# Altium footprint library 20210518.PcbLib: 414 footprints (part 8 of 26)
Each footprint in its own frame and in the unit in brackets; x right, y up, seen from the top. Pads: shape width x height; smd on the part's side, far side on the other; paste and mask are expansions set on the pad; w line width, h text height; cw(c..) or ccw(c..) is an arc to the next point about the centre after c.
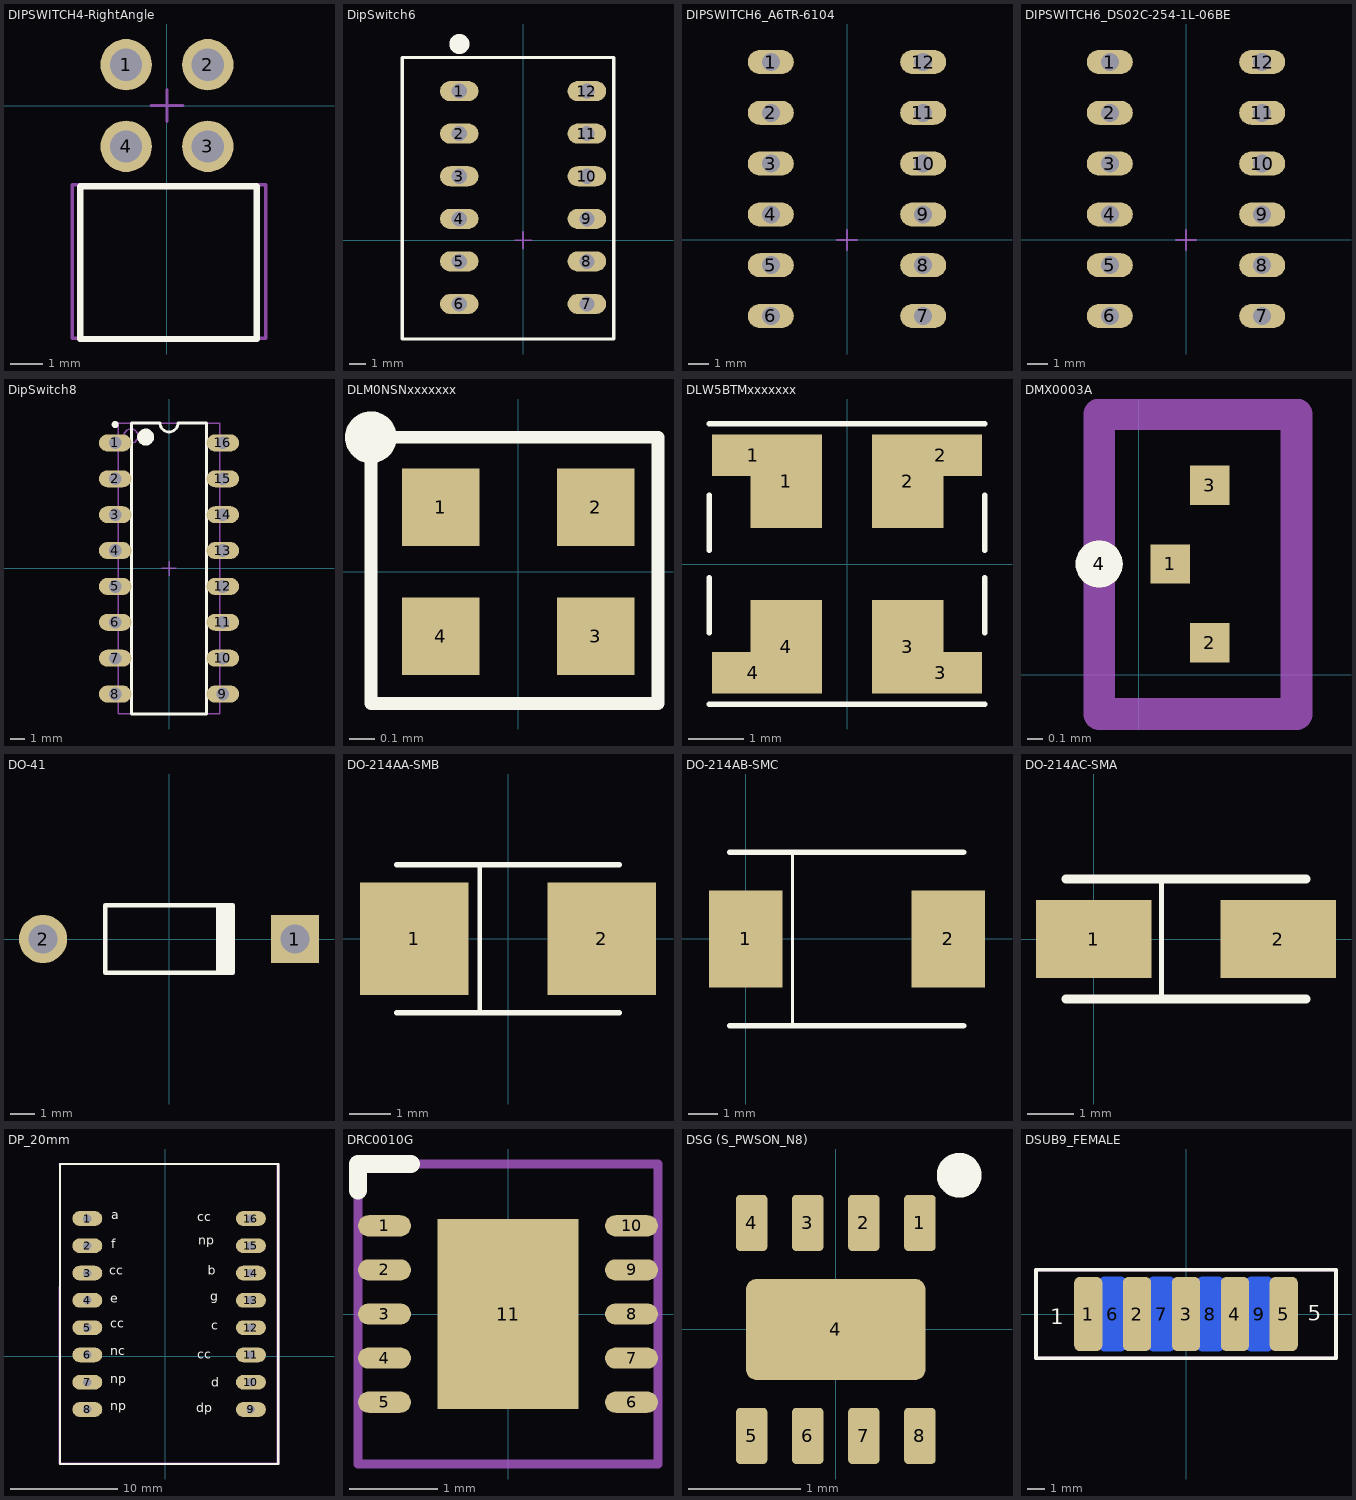
[diagram p7: the footprints below, top view; thin cyan lines are the x and y axes]

## DIPSWITCH4-RightAngle [mm]
pads (4):
  round 1.6 hole 1: 1(-1.27,1.27) 2(1.27,1.27) 3(1.27,-1.27) 4(-1.27,-1.27)
Top Overlay:
  lines w0.2: 2.769,-2.515 -2.701,-2.515 -2.701,-7.264 2.794,-7.264 2.794,-2.514
Mechanical 13:
  lines w0.1: -2.946,-7.239 -2.946,-2.464 3.073,-2.464 3.073,-7.239 -2.946,-7.239
Mechanical 15:
  lines w0.1: -0.5,0 0.5,0 ; 0,-0.5 0,0.5
3D body: height 9.79, standoff -3.04, extent -2.972,-8.356 3.124,1.664

## DipSwitch6 [mm]
pads (12):
  oval 2.3x1.2 hole 0.9: 1(-3.81,8.89) 2(-3.81,6.35) 3(-3.81,3.81) 4(-3.81,1.27) 5(-3.81,-1.27) 6(-3.81,-3.81) 7(3.81,-3.81) 8(3.81,-1.27) 9(3.81,1.27) 10(3.81,3.81) 11(3.81,6.35) 12(3.81,8.89)
Top Overlay:
  circle w0.6: c-3.8,11.7 r0.3
  lines w0.2: -7.2,-5.9 -7.2,10.9 5.4,10.9 5.4,-5.9 -7.2,-5.9
Mechanical 13:
  lines w0.1: -7.2,-5.9 -7.2,10.9 5.4,10.9 5.4,-5.9 -7.2,-5.9
Mechanical 15:
  lines w0.1: -0.5,0 0.5,0 ; 0,-0.5 0,0.5
3D body: height 10.4, standoff -3, extent -7.2,-5.9 5.4,10.9

## DIPSWITCH6_A6TR-6104 [mm] "Dip Switch SPST 6 Position Through Hole, Right Angle Piano Actuator 25mA 24VDC"
pads (12):
  oval 2.3x1.2 hole 0.9: 1(-3.81,8.89) 2(-3.81,6.35) 3(-3.81,3.81) 4(-3.81,1.27) 5(-3.81,-1.27) 6(-3.81,-3.81) 7(3.81,-3.81) 8(3.81,-1.27) 9(3.81,1.27) 10(3.81,3.81) 11(3.81,6.35) 12(3.81,8.89)
Mechanical 15:
  lines w0.1: -0.5,0 0.5,0 ; 0,-0.5 0,0.5
3D body: height 5, standoff -3.5, extent -4.02,-4.99 3.85,10.15

## DIPSWITCH6_DS02C-254-1L-06BE [mm] "Dip Switch SPST 6 Position Through Hole, Right Angle Piano Actuator 25mA 24VDC"
pads (12):
  oval 2.3x1.2 hole 0.9: 1(-3.81,8.89) 2(-3.81,6.35) 3(-3.81,3.81) 4(-3.81,1.27) 5(-3.81,-1.27) 6(-3.81,-3.81) 7(3.81,-3.81) 8(3.81,-1.27) 9(3.81,1.27) 10(3.81,3.81) 11(3.81,6.35) 12(3.81,8.89)
Mechanical 15:
  lines w0.1: -0.5,0 0.5,0 ; 0,-0.5 0,0.5
3D body: height 9.46, standoff -3.8, extent -5.11,-5.795 7.77,11.015

## DipSwitch8 [mm]
pads (16):
  oval 2.3x1.2 hole 0.9: 1(-3.81,8.89) 2(-3.81,6.35) 3(-3.81,3.81) 4(-3.81,1.27) 5(-3.81,-1.27) 6(-3.81,-3.81) 7(-3.81,-6.35) 8(-3.81,-8.89) 9(3.81,-8.89) 10(3.81,-6.35) 11(3.81,-3.81) 12(3.81,-1.27) 13(3.81,1.27) 14(3.81,3.81) 15(3.81,6.35) 16(3.81,8.89)
Top Overlay:
  circle w0.6: c-1.65,9.3 r0.3
  circle w0.25: c-3.81,10.19 r0.125
  lines w0.2: -2.65,-10.3 2.65,-10.3 2.65,10.3 0.635,10.3 cw(c0,10.3) -0.635,10.3 -2.65,10.3 -2.65,-10.3
Mechanical 13:
  circle w0.1: c-2.7,9.375 r0.5
  lines w0.1: -3.6,-10.275 3.6,-10.275 3.6,10.275 -3.6,10.275 -3.6,-10.275
Mechanical 15:
  lines w0.1: -0.5,0 0.5,0 ; 0,-0.5 0,0.5
3D body: height 8.25, standoff -3.5, extent -4.89,-11.25 4.89,11.25

## DLM0NSNxxxxxxx [mm]
pads (4):
  rect 0.3x0.3 smd mask+0: 1(-0.3,0.25) 2(0.3,0.25) 3(0.3,-0.25) 4(-0.3,-0.25)
Top Overlay:
  circle w0.1: c-0.57,0.52 r0.05
  lines w0.05: -0.57,-0.51 0.54,-0.51 0.54,0.52 -0.57,0.52 -0.57,-0.51
Top Solder:
  region: -0.15,0.1 -0.45,0.1 -0.45,0.4 -0.15,0.4
  region: 0.45,0.1 0.15,0.1 0.15,0.4 0.45,0.4
  region: -0.15,-0.4 -0.45,-0.4 -0.45,-0.1 -0.15,-0.1
  region: 0.45,-0.4 0.15,-0.4 0.15,-0.1 0.45,-0.1
3D body: height 0.5, standoff 0, extent -0.325,-0.425 0.325,0.425

## DLW5BTMxxxxxxx [mm] "5*5*3mm"
height 3
pads (8):
  rect 1.5x0.75 smd: 1(-1.7,1.975) 2(1.7,1.975) 3(1.7,-1.975) 4(-1.7,-1.975)
  rect 1.3x1.7 smd: 1(-1.1,1.5) 2(1.1,1.5) 3(1.1,-1.5) 4(-1.1,-1.5)
Top Overlay:
  lines w0.1: -2.5,-2.55 2.5,-2.55 ; -2.5,-1.25 -2.5,-0.25 ; -2.5,0.25 -2.5,1.25 ; -2.5,2.55 2.5,2.55 ; 2.5,-1.25 2.5,-0.25 ; 2.5,0.25 2.5,1.25
3D body: height 2.5, standoff 0, extent -2.5,-2.51 2.5,2.49

## DMX0003A [mm] "X2SON - 0.4 mm max height"
height 0.4
pads (4):
  rect 0.25x0.25 smd: 1(0.2,0.7) 2(0.45,0.2) 3(0.45,1.2)
  round 0.3 on Top Overlay: 4(-0.25,0.7)
3D Body:
  lines w0.2: -0.25,-0.25 -0.25,-0.2 -0.25,1.65 1,1.65 1,-0.25 -0.25,-0.25
3D body: height 0.4, standoff 0.01, extent 0,0 0.7,1.4

## DO-41 [mm] "Diode, Axial; Body 5.2 x 2.7 mm (LxDia. max), Lead Dia. 0.86 mm (max)"
height 2.8
pads (2):
  rect 2x2 hole 1.2: 1(5.23,0)
  round 2 hole 1.2: 2(-5.23,0)
Top Overlay:
  rectangle: 1.95,-1.4 2.75,1.4
  lines w0.2: 2.65,-1.4 -2.65,-1.4 -2.65,1.4 2.65,1.4
3D body: height 2.83, standoff -2.52, extent -5.268,-1.3 5.117,1.4

## DO-214AA-SMB [mm] "No Polarity"
height 2.642
pads (2):
  rect 2.6x2.7 smd: 1(-2.25,0) 2(2.25,0)
Top Overlay:
  lines w0.1: -0.68,-1.79 -0.68,1.778
  lines w0.127: -2.667,-1.778 2.667,-1.778 ; -2.667,1.778 2.667,1.778
3D body: height 2.35, standoff 0.05, extent -2.7,-1.8 2.7,1.8

## DO-214AB-SMC [mm] "No Polarity"
height 2.642
pads (2):
  rect 2.5x3.3 smd: 1(0,0) 2(6.9,0)
Top Overlay:
  lines w0.1: 1.6,-2.94 1.6,2.95
  lines w0.2: -0.535,-2.95 7.415,-2.95 ; -0.535,2.95 7.415,2.95
3D body: height 2.35, standoff 0.05, extent -0.535,-2.95 7.415,2.95

## DO-214AC-SMA [mm] "No Polarity"
height 2.642
pads (2):
  rect 2.5x1.7 smd: 1(0,0) 2(4,0)
Top Overlay:
  lines w0.1: 1.47,-1.28 1.47,1.29
  lines w0.2: -0.6,-1.3 4.6,-1.3 ; -0.6,1.3 4.6,1.3
3D body: height 2.4, standoff 0, extent -0.6,-1.3 4.6,1.3

## DP_20mm [mil]
pads (16):
  oval 110x54 hole 31: 1(-285,505) 2(-285,405) 3(-285,305) 4(-285,205) 5(-285,105) 6(-285,5) 7(-285,-95) 8(-285,-195) 9(315,-195) 10(315,-95) 11(315,5) 12(315,105) 13(315,205) 14(315,305) 15(315,405) 16(315,505)
Top Overlay:
  lines w8: -385,-395 415,-395 415,705 -385,705 -385,-395
  text "a" at -196.85,492.13 h56.25
  text "cc" at -200.79,94.49 h56.25
  text "g" at 165.35,192.91 h56.25
  text "dp" at 114.17,-216.54 h56.25
  text "cc" at 118.11,484.25 h56.25
  text "b" at 157.48,287.4 h56.25
  text "cc" at -204.72,287.4 h56.25
  text "cc" at 118.11,-19.68 h56.25
  text "f" at -196.85,385.83 h56.25
  text "nc" at -200.79,-7.87 h56.25
  text "np" at -200.79,-208.66 h56.25
  text "e" at -200.79,185.04 h56.25
  text "d" at 169.29,-122.05 h56.25
  text "c" at 169.29,86.61 h56.25
  text "np" at 122.05,397.64 h56.25
  text "np" at -200.79,-110.24 h56.25
3D Body:
  lines w8: -385.83,254.17 -385.83,-393.7 413.39,-393.7 413.39,704.72 ; -385.83,704.72 413.39,704.72 ; 413.39,501.8 413.39,704.72
Mechanical 15:
  lines w8: -385,-395 -385,705 415,705 415,-395 -385,-395
3D body: height 326.77, standoff -168.5, extent -374.02,-403.35 411.81,686.81

## DRC0010G [mm]
pads (11):
  oval 0.6x0.24 smd mask+0.051: 1(-1.4,1) 2(-1.4,0.5) 3(-1.4,0) 4(-1.4,-0.5) 5(-1.4,-1) 6(1.4,-1) 7(1.4,-0.5) 8(1.4,0) 9(1.4,0.5) 10(1.4,1)
  rect 1.6x2.15 smd paste-0.825 mask+0.051: 11(0,0)
Top Overlay:
  lines w0.2: -1.7,1.4 -1.7,1.7 -1.1,1.7
Top Paste:
  region: -0.685,1.039 -0.685,0.1 0.681,0.1 0.681,1.039
  region: -0.69,-0.1 -0.69,-1.039 0.676,-1.039 0.676,-0.1
  region: -0.756,1.551 -0.756,1.117 -0.474,1.117 -0.474,1.551
  region: -0.346,1.551 -0.346,1.117 -0.064,1.117 -0.064,1.551
  region: 0.064,1.551 0.064,1.117 0.346,1.117 0.346,1.551
  region: 0.474,1.551 0.474,1.117 0.756,1.117 0.756,1.551
  region: 0.756,-1.551 0.756,-1.117 0.474,-1.117 0.474,-1.551
  region: 0.346,-1.551 0.346,-1.117 0.064,-1.117 0.064,-1.551
  region: -0.064,-1.551 -0.064,-1.117 -0.346,-1.117 -0.346,-1.551
  region: -0.474,-1.551 -0.474,-1.117 -0.756,-1.117 -0.756,-1.551
Top Solder:
  region: 0.756,-1.551 0.756,-0.999 0.474,-0.999 0.474,-1.551
  region: 0.346,-1.551 0.346,-0.999 0.064,-0.999 0.064,-1.551
  region: -0.064,-1.551 -0.064,-0.999 -0.346,-0.999 -0.346,-1.551
  region: -0.474,-1.551 -0.474,-0.999 -0.756,-0.999 -0.756,-1.551
  region: -0.474,0.999 -0.474,1.551 -0.756,1.551 -0.756,0.999
  region: -0.064,0.999 -0.064,1.551 -0.346,1.551 -0.346,0.999
  region: 0.346,0.999 0.346,1.551 0.064,1.551 0.064,0.999
  region: 0.756,0.999 0.756,1.551 0.474,1.551 0.474,0.999
Mechanical 15:
  lines w0.1: -1.7,-1.7 -1.7,1.7 1.7,1.7 1.7,-1.7 -1.7,-1.7
3D body: height 0.77, standoff 0, extent -1.5,-1.5 1.5,1.5

## DSG (S_PWSON_N8) [mm]
pads (9):
  rrect25% 0.28x0.5 smd mask+0.076: 1(0.75,0.95) 2(0.25,0.95) 3(-0.25,0.95) 4(-0.75,0.95) 5(-0.75,-0.95) 6(-0.25,-0.95) 7(0.25,-0.95) 8(0.75,-0.95)
  rrect20% 1.6x0.9 smd mask+0.076: 4(0,0)
Top Overlay:
  circle w0.2: c1.1,1.375 r0.1
3D body: height 0.25, standoff 0, extent -0.8,-0.45 0.8,0.45
3D body: height 0.25, standoff 0, extent -0.875,0.715 -0.625,1.015
3D body: height 0.25, standoff 0, extent -0.375,0.715 -0.125,1.015
3D body: height 0.25, standoff 0, extent 0.125,0.715 0.375,1.015
3D body: height 0.25, standoff 0, extent 0.625,0.715 0.875,1.015
3D body: height 0.25, standoff 0, extent 0.625,-1.015 0.875,-0.715
3D body: height 0.25, standoff 0, extent 0.125,-1.015 0.375,-0.715
3D body: height 0.25, standoff 0, extent -0.375,-1.015 -0.125,-0.715
3D body: height 0.25, standoff 0, extent -0.875,-1.015 -0.625,-0.715
3D body: height 0.81, standoff 0.7, extent 0.65,0.65 0.849,0.85
3D body: height 0.8, standoff 0.01, extent -1,-1 1,1

## DSUB9_FEMALE [mm] "Desub; 9 Position, 2.5mm pin space"
height 12.54
pads (9):
  rrect40% 1.6x4.2 smd paste-1: 1(-5.54,0) 2(-2.77,0) 3(0,0) 4(2.77,0) 5(5.54,0)
  rrect40% 1.6x4.2 smd far side paste-1: 6(-4.155,0) 7(-1.385,0) 8(1.385,0) 9(4.155,0)
Top Overlay:
  lines w0.2: -8.5,-2.5 8.5,-2.5 8.5,2.5 -8.5,2.5 -8.5,-2.5
  text "1" at -7.7,-0.9 h1.52
  text "5" at 6.9,-0.7 h1.52
Bottom Overlay:
  text "9" at 7.8,-0.7 h1.52
  text "6" at -6.9,-1 h1.52
Mechanical 13:
  lines w0.2: -8.5,-2.5 -8.5,2.5 8.5,2.5 8.5,-2.5 -8.5,-2.5
Mechanical 15:
  lines w0.2: -8.5,-2.5 -8.5,2.5 8.5,2.5 8.5,-2.5 -8.5,-2.5
3D body: height 6.21, standoff -6.21, extent -15.435,-0.366 15.235,14.13